# Altium footprint library Cymometer.PcbLib: 22 footprints (part 2 of 2)
Each footprint in its own frame and in the unit in brackets; x right, y up, seen from the top. Pads: shape width x height; smd on the part's side, far side on the other; paste and mask are expansions set on the pad; w line width, h text height; cw(c..) or ccw(c..) is an arc to the next point about the centre after c.
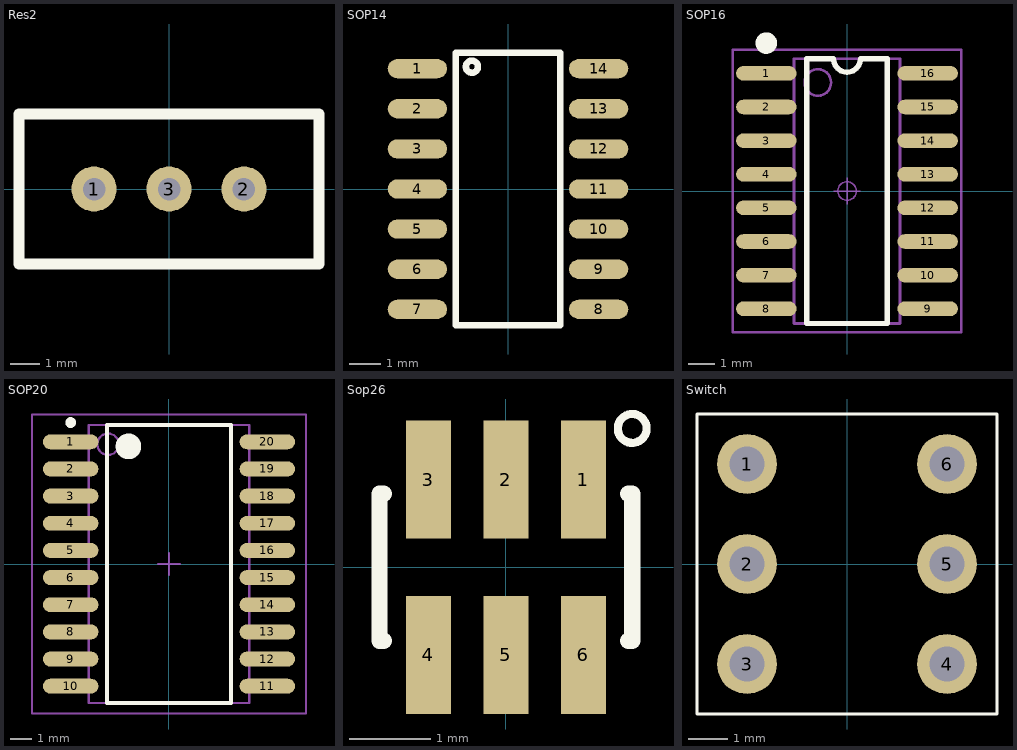
[diagram p1: the footprints below, top view; thin cyan lines are the x and y axes]

## Res2 [mil]
pads (3):
  round 60 hole 30: 1(-100,0) 2(100,0) 3(0,0)
Top Overlay:
  lines w15: -200,-100 200,-100 200,100 -200,100 -200,-100

## SOP14 [mil]
pads (14):
  oval 74x24 smd: 1(-113,150) 2(-113,100) 3(-113,50) 4(-113,0) 5(-113,-50) 6(-113,-100) 7(-113,-150) 8(113,-150) 9(113,-100) 10(113,-50) 11(113,0) 12(113,50) 13(113,100) 14(113,150)
Top Overlay:
  circle w8: c-45,152.5 r7.5
  lines w8: -65,-170 65,-170 65,170 -65,170 -65,-170
3D body: height 61.02, standoff -1.97, extent -117.83,-171.06 118,171.06

## SOP16 [mil]
pads (16):
  oval 90x21.65 smd: 1(-120,175) 2(-120,125) 3(-120,75) 4(-120,25) 5(-120,-25) 6(-120,-75) 7(-120,-125) 8(-120,-175) 9(120,-175) 10(120,-125) 11(120,-75) 12(120,-25) 13(120,25) 14(120,75) 15(120,125) 16(120,175)
Top Overlay:
  circle w19.68: c-120,220 r6.08
  lines w7.87: -60,196.85 -60,-196.85 60,-196.85 60,196.85
  lines w8: -60,196.85 -20,196.85 ccw(c0,196.85) 0,176.85 ccw(c0,196.85) 20,196.85 60,196.85
Mechanical 13:
  circle w3.94: c-43.31,161.42 r19.68
  lines w3.94: -78.74,-196.85 -78.74,196.85 78.74,196.85 78.74,-196.85 -78.74,-196.85
Mechanical 15:
  circle w1.97: c0,0 r13.78
  lines w1.97: -19.68,0 19.68,0 ; 0,-19.68 0,19.68
  lines w3.94: -170,-210 -170,210 170,210 170,-210 -170,-210
3D body: height 74.8, standoff 0, extent -118.25,-196.85 118.25,196.85

## SOP20 [mm]
pads (20):
  oval 2.6x0.7 smd: 1(-4.6,5.715) 2(-4.6,4.445) 3(-4.6,3.175) 4(-4.6,1.905) 5(-4.6,0.635) 6(-4.6,-0.635) 7(-4.6,-1.905) 8(-4.6,-3.175) 9(-4.6,-4.445) 10(-4.6,-5.715) 11(4.6,-5.715) 12(4.6,-4.445) 13(4.6,-3.175) 14(4.6,-1.905) 15(4.6,-0.635) 16(4.6,0.635) 17(4.6,1.905) 18(4.6,3.175) 19(4.6,4.445) 20(4.6,5.715)
Top Overlay:
  circle w0.6: c-1.9,5.5 r0.3
  circle w0.25: c-4.6,6.615 r0.125
  lines w0.2: -2.9,-6.5 -2.9,6.5 2.9,6.5 2.9,-6.5 -2.9,-6.5
Mechanical 13:
  circle w0.1: c-2.85,5.6 r0.5
  lines w0.1: -3.75,-6.5 -3.75,6.5 3.75,6.5 3.75,-6.5 -3.75,-6.5
Mechanical 15:
  lines w0.1: -0.5,0 0.5,0 ; 0,-0.5 0,0.5 ; -6.4,-7 -6.4,7 6.4,7 6.4,-7 -6.4,-7
3D body: height 2.65, standoff 0, extent -5.105,-6.4 5.195,6.4

## Sop26 [mm]
pads (6):
  rect 0.55x1.45 smd: 1(0.95,1.075) 2(0,1.075) 3(-0.95,1.075) 4(-0.95,-1.075) 5(0,-1.075) 6(0.95,-1.075)
Top Overlay:
  circle w0.1: c1.549,1.702 r0.177
  lines w0.2: -1.5,-0.9 -1.55,-0.9 -1.55,0.9 -1.5,0.9 ; 1.5,-0.9 1.55,-0.9 1.55,0.9 1.5,0.9
3D body: height 1.08, standoff -0.01, extent -1.397,-1.194 1.397,1.232

## Switch [mil]
pads (6):
  round 60 hole 35: 1(-100,100) 2(-100,0) 3(-100,-100) 4(100,-100) 5(100,0) 6(100,100)
Top Overlay:
  lines w3: -150,-150 -150,150 150,150 150,-150 -150,-150